# Altium integrated library WCAP-ATG5_rev15a.intlib: 201 symbols (part 1 of 3)
Pins are listed as number, name and electrical type; pins without a type are passive.

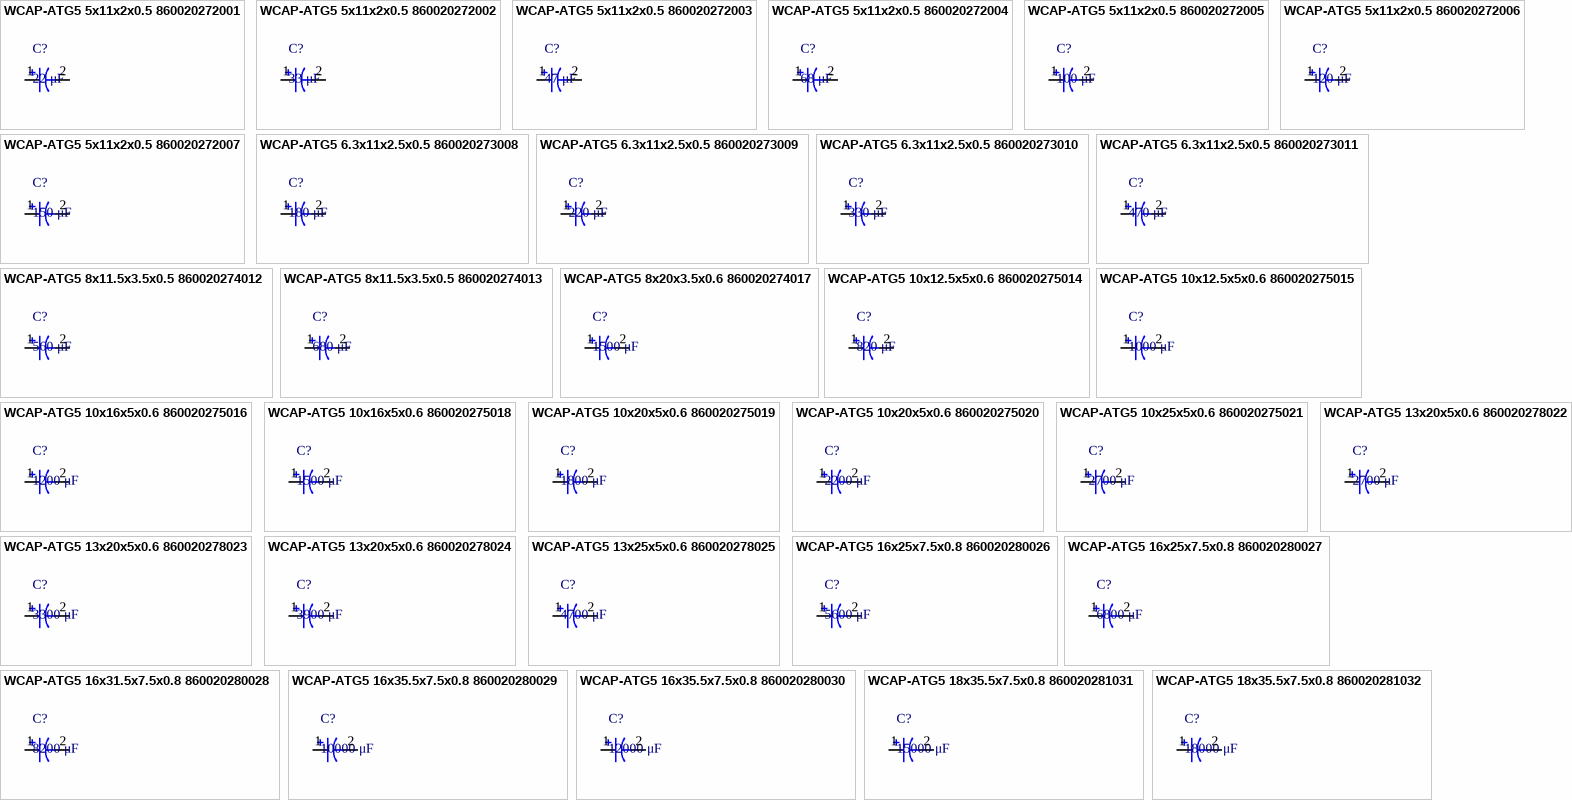
[diagram p0: symbols WCAP-ATG5 5x11x2x0.5 860020272001 to WCAP-ATG5 18x35.5x7.5x0.8 860020281032]

## WCAP-ATG5 5x11x2x0.5 860020272001
designator C?, comment 22 μF
WCAP-ATG5 Aluminum Electrolytic Capacitors , 22 μF; + / - 20%; 10 V , 5 x 11; Manufacturer: Wurth Elektronik; partNo: 860020272001; E-mail: libraries@we-online.com; Characteristics: Aluminum Electrolytic Capacitor; Recommended soldering: Wave; Operating temperature:–40 °C to +105 °C for UR < 400 V; –25 °C to +105 °C for UR ≥ 400 V; General purpose product series with max. temperature of +105 °C; Load life: 2000 h @ +105 °C; ComponentLink1Description: Manufacturer; ComponentLink1URL: http://www.we-online.com; ComponentLink2Description: Datasheet; ComponentLink2URL: http://katalog.we-online.de/pbs/datasheet/860020272001.pdf; Created by: Karrer Zheng; Created Date: 6/8/2015; Capacitance: 22 μF; Application: Medium and high voltage type range from 160V-450V used as primary side input filter in power supply; Low voltage type used as energy storage or low frequency filtering in circuit, applied to general switching power supply, AC-DC converter, adapter, charger, TV, VCR, DC motor circuit filter, digital audio, digital cameras, digital video cameras, satellite receiver etc.
footprint WCAP-ATG5 5x11x2x0.5
pins: 1, 2

## WCAP-ATG5 5x11x2x0.5 860020272002
designator C?, comment 33 μF
WCAP-ATG5 Aluminum Electrolytic Capacitors , 33 μF; + / - 20%; 10 V , 5 x 11; Manufacturer: Wurth Elektronik; partNo: 860020272002; E-mail: libraries@we-online.com; Characteristics: Aluminum Electrolytic Capacitor; Recommended soldering: Wave; Operating temperature:–40 °C to +105 °C for UR < 400 V; –25 °C to +105 °C for UR ≥ 400 V; General purpose product series with max. temperature of +105 °C; Load life: 2000 h @ +105 °C; ComponentLink1Description: Manufacturer; ComponentLink1URL: http://www.we-online.com; ComponentLink2Description: Datasheet; ComponentLink2URL: http://katalog.we-online.de/pbs/datasheet/860020272002.pdf; Created by: Karrer Zheng; Created Date: 6/8/2015; Capacitance: 33 μF; Application: Medium and high voltage type range from 160V-450V used as primary side input filter in power supply; Low voltage type used as energy storage or low frequency filtering in circuit, applied to general switching power supply, AC-DC converter, adapter, charger, TV, VCR, DC motor circuit filter, digital audio, digital cameras, digital video cameras, satellite receiver etc.
footprint WCAP-ATG5 5x11x2x0.5
pins: 1, 2

## WCAP-ATG5 5x11x2x0.5 860020272003
designator C?, comment 47 μF
WCAP-ATG5 Aluminum Electrolytic Capacitors , 47 μF; + / - 20%; 10 V , 5 x 11; Manufacturer: Wurth Elektronik; partNo: 860020272003; E-mail: libraries@we-online.com; Characteristics: Aluminum Electrolytic Capacitor; Recommended soldering: Wave; Operating temperature:–40 °C to +105 °C for UR < 400 V; –25 °C to +105 °C for UR ≥ 400 V; General purpose product series with max. temperature of +105 °C; Load life: 2000 h @ +105 °C; ComponentLink1Description: Manufacturer; ComponentLink1URL: http://www.we-online.com; ComponentLink2Description: Datasheet; ComponentLink2URL: http://katalog.we-online.de/pbs/datasheet/860020272003.pdf; Created by: Karrer Zheng; Created Date: 6/8/2015; Capacitance: 47 μF; Application: Medium and high voltage type range from 160V-450V used as primary side input filter in power supply; Low voltage type used as energy storage or low frequency filtering in circuit, applied to general switching power supply, AC-DC converter, adapter, charger, TV, VCR, DC motor circuit filter, digital audio, digital cameras, digital video cameras, satellite receiver etc.
footprint WCAP-ATG5 5x11x2x0.5
pins: 1, 2

## WCAP-ATG5 5x11x2x0.5 860020272004
designator C?, comment 68 μF
WCAP-ATG5 Aluminum Electrolytic Capacitors , 68 μF; + / - 20%; 10 V , 5 x 11; Manufacturer: Wurth Elektronik; partNo: 860020272004; E-mail: libraries@we-online.com; Characteristics: Aluminum Electrolytic Capacitor; Recommended soldering: Wave; Operating temperature:–40 °C to +105 °C for UR < 400 V; –25 °C to +105 °C for UR ≥ 400 V; General purpose product series with max. temperature of +105 °C; Load life: 2000 h @ +105 °C; ComponentLink1Description: Manufacturer; ComponentLink1URL: http://www.we-online.com; ComponentLink2Description: Datasheet; ComponentLink2URL: http://katalog.we-online.de/pbs/datasheet/860020272004.pdf; Created by: Karrer Zheng; Created Date: 6/8/2015; Capacitance: 68 μF; Application: Medium and high voltage type range from 160V-450V used as primary side input filter in power supply; Low voltage type used as energy storage or low frequency filtering in circuit, applied to general switching power supply, AC-DC converter, adapter, charger, TV, VCR, DC motor circuit filter, digital audio, digital cameras, digital video cameras, satellite receiver etc.
footprint WCAP-ATG5 5x11x2x0.5
pins: 1, 2

## WCAP-ATG5 5x11x2x0.5 860020272005
designator C?, comment 100 μF
WCAP-ATG5 Aluminum Electrolytic Capacitors , 100 μF; + / - 20%; 10 V , 5 x 11; Manufacturer: Wurth Elektronik; partNo: 860020272005; E-mail: libraries@we-online.com; Characteristics: Aluminum Electrolytic Capacitor; Recommended soldering: Wave; Operating temperature:–40 °C to +105 °C for UR < 400 V; –25 °C to +105 °C for UR ≥ 400 V; General purpose product series with max. temperature of +105 °C; Load life: 2000 h @ +105 °C; ComponentLink1Description: Manufacturer; ComponentLink1URL: http://www.we-online.com; ComponentLink2Description: Datasheet; ComponentLink2URL: http://katalog.we-online.de/pbs/datasheet/860020272005.pdf; Created by: Karrer Zheng; Created Date: 6/8/2015; Capacitance: 100 μF; Application: Medium and high voltage type range from 160V-450V used as primary side input filter in power supply; Low voltage type used as energy storage or low frequency filtering in circuit, applied to general switching power supply, AC-DC converter, adapter, charger, TV, VCR, DC motor circuit filter, digital audio, digital cameras, digital video cameras, satellite receiver etc.
footprint WCAP-ATG5 5x11x2x0.5
pins: 1, 2

## WCAP-ATG5 5x11x2x0.5 860020272006
designator C?, comment 120 μF
WCAP-ATG5 Aluminum Electrolytic Capacitors , 120 μF; + / - 20%; 10 V , 5 x 11; Manufacturer: Wurth Elektronik; partNo: 860020272006; E-mail: libraries@we-online.com; Characteristics: Aluminum Electrolytic Capacitor; Recommended soldering: Wave; Operating temperature:–40 °C to +105 °C for UR < 400 V; –25 °C to +105 °C for UR ≥ 400 V; General purpose product series with max. temperature of +105 °C; Load life: 2000 h @ +105 °C; ComponentLink1Description: Manufacturer; ComponentLink1URL: http://www.we-online.com; ComponentLink2Description: Datasheet; ComponentLink2URL: http://katalog.we-online.de/pbs/datasheet/860020272006.pdf; Created by: Karrer Zheng; Created Date: 6/8/2015; Capacitance: 120 μF; Application: Medium and high voltage type range from 160V-450V used as primary side input filter in power supply; Low voltage type used as energy storage or low frequency filtering in circuit, applied to general switching power supply, AC-DC converter, adapter, charger, TV, VCR, DC motor circuit filter, digital audio, digital cameras, digital video cameras, satellite receiver etc.
footprint WCAP-ATG5 5x11x2x0.5
pins: 1, 2

## WCAP-ATG5 5x11x2x0.5 860020272007
designator C?, comment 150 μF
WCAP-ATG5 Aluminum Electrolytic Capacitors , 150 μF; + / - 20%; 10 V , 5 x 11; Manufacturer: Wurth Elektronik; partNo: 860020272007; E-mail: libraries@we-online.com; Characteristics: Aluminum Electrolytic Capacitor; Recommended soldering: Wave; Operating temperature:–40 °C to +105 °C for UR < 400 V; –25 °C to +105 °C for UR ≥ 400 V; General purpose product series with max. temperature of +105 °C; Load life: 2000 h @ +105 °C; ComponentLink1Description: Manufacturer; ComponentLink1URL: http://www.we-online.com; ComponentLink2Description: Datasheet; ComponentLink2URL: http://katalog.we-online.de/pbs/datasheet/860020272007.pdf; Created by: Karrer Zheng; Created Date: 6/8/2015; Capacitance: 150 μF; Application: Medium and high voltage type range from 160V-450V used as primary side input filter in power supply; Low voltage type used as energy storage or low frequency filtering in circuit, applied to general switching power supply, AC-DC converter, adapter, charger, TV, VCR, DC motor circuit filter, digital audio, digital cameras, digital video cameras, satellite receiver etc.
footprint WCAP-ATG5 5x11x2x0.5
pins: 1, 2

## WCAP-ATG5 6.3x11x2.5x0.5 860020273008
designator C?, comment 180 μF
WCAP-ATG5 Aluminum Electrolytic Capacitors , 180 μF; + / - 20%; 10 V , 6,3 x 11; Manufacturer: Wurth Elektronik; partNo: 860020273008; E-mail: libraries@we-online.com; Characteristics: Aluminum Electrolytic Capacitor; Recommended soldering: Wave; Operating temperature:–40 °C to +105 °C for UR < 400 V; –25 °C to +105 °C for UR ≥ 400 V; General purpose product series with max. temperature of +105 °C; Load life: 2000 h @ +105 °C; ComponentLink1Description: Manufacturer; ComponentLink1URL: http://www.we-online.com; ComponentLink2Description: Datasheet; ComponentLink2URL: http://katalog.we-online.de/pbs/datasheet/860020273008.pdf; Created by: Karrer Zheng; Created Date: 6/8/2015; Capacitance: 180 μF; Application: Medium and high voltage type range from 160V-450V used as primary side input filter in power supply; Low voltage type used as energy storage or low frequency filtering in circuit, applied to general switching power supply, AC-DC converter, adapter, charger, TV, VCR, DC motor circuit filter, digital audio, digital cameras, digital video cameras, satellite receiver etc.
footprint WCAP-ATG5 6.3x11x2.5x0.5
pins: 1, 2

## WCAP-ATG5 6.3x11x2.5x0.5 860020273009
designator C?, comment 220 μF
WCAP-ATG5 Aluminum Electrolytic Capacitors , 220 μF; + / - 20%; 10 V , 6,3 x 11; Manufacturer: Wurth Elektronik; partNo: 860020273009; E-mail: libraries@we-online.com; Characteristics: Aluminum Electrolytic Capacitor; Recommended soldering: Wave; Operating temperature:–40 °C to +105 °C for UR < 400 V; –25 °C to +105 °C for UR ≥ 400 V; General purpose product series with max. temperature of +105 °C; Load life: 2000 h @ +105 °C; ComponentLink1Description: Manufacturer; ComponentLink1URL: http://www.we-online.com; ComponentLink2Description: Datasheet; ComponentLink2URL: http://katalog.we-online.de/pbs/datasheet/860020273009.pdf; Created by: Karrer Zheng; Created Date: 6/8/2015; Capacitance: 220 μF; Application: Medium and high voltage type range from 160V-450V used as primary side input filter in power supply; Low voltage type used as energy storage or low frequency filtering in circuit, applied to general switching power supply, AC-DC converter, adapter, charger, TV, VCR, DC motor circuit filter, digital audio, digital cameras, digital video cameras, satellite receiver etc.
footprint WCAP-ATG5 6.3x11x2.5x0.5
pins: 1, 2

## WCAP-ATG5 6.3x11x2.5x0.5 860020273010
designator C?, comment 330 μF
WCAP-ATG5 Aluminum Electrolytic Capacitors , 330 μF; + / - 20%; 10 V , 6,3 x 11; Manufacturer: Wurth Elektronik; partNo: 860020273010; E-mail: libraries@we-online.com; Characteristics: Aluminum Electrolytic Capacitor; Recommended soldering: Wave; Operating temperature:–40 °C to +105 °C for UR < 400 V; –25 °C to +105 °C for UR ≥ 400 V; General purpose product series with max. temperature of +105 °C; Load life: 2000 h @ +105 °C; ComponentLink1Description: Manufacturer; ComponentLink1URL: http://www.we-online.com; ComponentLink2Description: Datasheet; ComponentLink2URL: http://katalog.we-online.de/pbs/datasheet/860020273010.pdf; Created by: Karrer Zheng; Created Date: 6/8/2015; Capacitance: 330 μF; Application: Medium and high voltage type range from 160V-450V used as primary side input filter in power supply; Low voltage type used as energy storage or low frequency filtering in circuit, applied to general switching power supply, AC-DC converter, adapter, charger, TV, VCR, DC motor circuit filter, digital audio, digital cameras, digital video cameras, satellite receiver etc.
footprint WCAP-ATG5 6.3x11x2.5x0.5
pins: 1, 2

## WCAP-ATG5 6.3x11x2.5x0.5 860020273011
designator C?, comment 470 μF
WCAP-ATG5 Aluminum Electrolytic Capacitors , 470 μF; + / - 20%; 10 V , 6,3 x 11; Manufacturer: Wurth Elektronik; partNo: 860020273011; E-mail: libraries@we-online.com; Characteristics: Aluminum Electrolytic Capacitor; Recommended soldering: Wave; Operating temperature:–40 °C to +105 °C for UR < 400 V; –25 °C to +105 °C for UR ≥ 400 V; General purpose product series with max. temperature of +105 °C; Load life: 2000 h @ +105 °C; ComponentLink1Description: Manufacturer; ComponentLink1URL: http://www.we-online.com; ComponentLink2Description: Datasheet; ComponentLink2URL: http://katalog.we-online.de/pbs/datasheet/860020273011.pdf; Created by: Karrer Zheng; Created Date: 6/8/2015; Capacitance: 470 μF; Application: Medium and high voltage type range from 160V-450V used as primary side input filter in power supply; Low voltage type used as energy storage or low frequency filtering in circuit, applied to general switching power supply, AC-DC converter, adapter, charger, TV, VCR, DC motor circuit filter, digital audio, digital cameras, digital video cameras, satellite receiver etc.
footprint WCAP-ATG5 6.3x11x2.5x0.5
pins: 1, 2

## WCAP-ATG5 8x11.5x3.5x0.5 860020274012
designator C?, comment 560 μF
WCAP-ATG5 Aluminum Electrolytic Capacitors , 560 μF; + / - 20%; 10 V , 8 x 11,5; Manufacturer: Wurth Elektronik; partNo: 860020274012; E-mail: libraries@we-online.com; Characteristics: Aluminum Electrolytic Capacitor; Recommended soldering: Wave; Operating temperature:–40 °C to +105 °C for UR < 400 V; –25 °C to +105 °C for UR ≥ 400 V; General purpose product series with max. temperature of +105 °C; Load life: 2000 h @ +105 °C; ComponentLink1Description: Manufacturer; ComponentLink1URL: http://www.we-online.com; ComponentLink2Description: Datasheet; ComponentLink2URL: http://katalog.we-online.de/pbs/datasheet/860020274012.pdf; Created by: Karrer Zheng; Created Date: 6/8/2015; Capacitance: 560 μF; Application: Medium and high voltage type range from 160V-450V used as primary side input filter in power supply; Low voltage type used as energy storage or low frequency filtering in circuit, applied to general switching power supply, AC-DC converter, adapter, charger, TV, VCR, DC motor circuit filter, digital audio, digital cameras, digital video cameras, satellite receiver etc.
footprint WCAP-ATG5 8x11.5x3.5x0.5
pins: 1, 2

## WCAP-ATG5 8x11.5x3.5x0.5 860020274013
designator C?, comment 680 μF
WCAP-ATG5 Aluminum Electrolytic Capacitors , 680 μF; + / - 20%; 10 V , 8 x 11,5; Manufacturer: Wurth Elektronik; partNo: 860020274013; E-mail: libraries@we-online.com; Characteristics: Aluminum Electrolytic Capacitor; Recommended soldering: Wave; Operating temperature:–40 °C to +105 °C for UR < 400 V; –25 °C to +105 °C for UR ≥ 400 V; General purpose product series with max. temperature of +105 °C; Load life: 2000 h @ +105 °C; ComponentLink1Description: Manufacturer; ComponentLink1URL: http://www.we-online.com; ComponentLink2Description: Datasheet; ComponentLink2URL: http://katalog.we-online.de/pbs/datasheet/860020274013.pdf; Created by: Karrer Zheng; Created Date: 6/8/2015; Capacitance: 680 μF; Application: Medium and high voltage type range from 160V-450V used as primary side input filter in power supply; Low voltage type used as energy storage or low frequency filtering in circuit, applied to general switching power supply, AC-DC converter, adapter, charger, TV, VCR, DC motor circuit filter, digital audio, digital cameras, digital video cameras, satellite receiver etc.
footprint WCAP-ATG5 8x11.5x3.5x0.5
pins: 1, 2

## WCAP-ATG5 8x20x3.5x0.6 860020274017
designator C?, comment 1500 μF
WCAP-ATG5 Aluminum Electrolytic Capacitors , 1500 μF; + / - 20%; 10 V , 8 x 20; Manufacturer: Wurth Elektronik; partNo: 860020274017; E-mail: libraries@we-online.com; Characteristics: Aluminum Electrolytic Capacitor; Recommended soldering: Wave; Operating temperature:–40 °C to +105 °C for UR < 400 V; –25 °C to +105 °C for UR ≥ 400 V; General purpose product series with max. temperature of +105 °C; Load life: 2000 h @ +105 °C; ComponentLink1Description: Manufacturer; ComponentLink1URL: http://www.we-online.com; ComponentLink2Description: Datasheet; ComponentLink2URL: http://katalog.we-online.de/pbs/datasheet/860020274017.pdf; Created by: Karrer Zheng; Created Date: 6/8/2015; Capacitance: 1500 μF; Application: Medium and high voltage type range from 160V-450V used as primary side input filter in power supply; Low voltage type used as energy storage or low frequency filtering in circuit, applied to general switching power supply, AC-DC converter, adapter, charger, TV, VCR, DC motor circuit filter, digital audio, digital cameras, digital video cameras, satellite receiver etc.
footprint WCAP-ATG5 8x20x3.5x0.6
pins: 1, 2

## WCAP-ATG5 10x12.5x5x0.6 860020275014
designator C?, comment 820 μF
WCAP-ATG5 Aluminum Electrolytic Capacitors , 820 μF; + / - 20%; 10 V , 10 x 12,5; Manufacturer: Wurth Elektronik; partNo: 860020275014; E-mail: libraries@we-online.com; Characteristics: Aluminum Electrolytic Capacitor; Recommended soldering: Wave; Operating temperature:–40 °C to +105 °C for UR < 400 V; –25 °C to +105 °C for UR ≥ 400 V; General purpose product series with max. temperature of +105 °C; Load life: 2000 h @ +105 °C; ComponentLink1Description: Manufacturer; ComponentLink1URL: http://www.we-online.com; ComponentLink2Description: Datasheet; ComponentLink2URL: http://katalog.we-online.de/pbs/datasheet/860020275014.pdf; Created by: Karrer Zheng; Created Date: 6/8/2015; Capacitance: 820 μF; Application: Medium and high voltage type range from 160V-450V used as primary side input filter in power supply; Low voltage type used as energy storage or low frequency filtering in circuit, applied to general switching power supply, AC-DC converter, adapter, charger, TV, VCR, DC motor circuit filter, digital audio, digital cameras, digital video cameras, satellite receiver etc.
footprint WCAP-ATG5 10x12.5x5x0.6
pins: 1, 2

## WCAP-ATG5 10x12.5x5x0.6 860020275015
designator C?, comment 1000 μF
WCAP-ATG5 Aluminum Electrolytic Capacitors , 1000 μF; + / - 20%; 10 V , 10 x 12,5; Manufacturer: Wurth Elektronik; partNo: 860020275015; E-mail: libraries@we-online.com; Characteristics: Aluminum Electrolytic Capacitor; Recommended soldering: Wave; Operating temperature:–40 °C to +105 °C for UR < 400 V; –25 °C to +105 °C for UR ≥ 400 V; General purpose product series with max. temperature of +105 °C; Load life: 2000 h @ +105 °C; ComponentLink1Description: Manufacturer; ComponentLink1URL: http://www.we-online.com; ComponentLink2Description: Datasheet; ComponentLink2URL: http://katalog.we-online.de/pbs/datasheet/860020275015.pdf; Created by: Karrer Zheng; Created Date: 6/8/2015; Capacitance: 1000 μF; Application: Medium and high voltage type range from 160V-450V used as primary side input filter in power supply; Low voltage type used as energy storage or low frequency filtering in circuit, applied to general switching power supply, AC-DC converter, adapter, charger, TV, VCR, DC motor circuit filter, digital audio, digital cameras, digital video cameras, satellite receiver etc.
footprint WCAP-ATG5 10x12.5x5x0.6
pins: 1, 2

## WCAP-ATG5 10x16x5x0.6 860020275016
designator C?, comment 1200 μF
WCAP-ATG5 Aluminum Electrolytic Capacitors , 1200 μF; + / - 20%; 10 V , 10 x 16; Manufacturer: Wurth Elektronik; partNo: 860020275016; E-mail: libraries@we-online.com; Characteristics: Aluminum Electrolytic Capacitor; Recommended soldering: Wave; Operating temperature:–40 °C to +105 °C for UR < 400 V; –25 °C to +105 °C for UR ≥ 400 V; General purpose product series with max. temperature of +105 °C; Load life: 2000 h @ +105 °C; ComponentLink1Description: Manufacturer; ComponentLink1URL: http://www.we-online.com; ComponentLink2Description: Datasheet; ComponentLink2URL: http://katalog.we-online.de/pbs/datasheet/860020275016.pdf; Created by: Karrer Zheng; Created Date: 6/8/2015; Capacitance: 1200 μF; Application: Medium and high voltage type range from 160V-450V used as primary side input filter in power supply; Low voltage type used as energy storage or low frequency filtering in circuit, applied to general switching power supply, AC-DC converter, adapter, charger, TV, VCR, DC motor circuit filter, digital audio, digital cameras, digital video cameras, satellite receiver etc.
footprint WCAP-ATG5 10x16x5x0.6
pins: 1, 2

## WCAP-ATG5 10x16x5x0.6 860020275018
designator C?, comment 1500 μF
WCAP-ATG5 Aluminum Electrolytic Capacitors , 1500 μF; + / - 20%; 10 V , 10 x 16; Manufacturer: Wurth Elektronik; partNo: 860020275018; E-mail: libraries@we-online.com; Characteristics: Aluminum Electrolytic Capacitor; Recommended soldering: Wave; Operating temperature:–40 °C to +105 °C for UR < 400 V; –25 °C to +105 °C for UR ≥ 400 V; General purpose product series with max. temperature of +105 °C; Load life: 2000 h @ +105 °C; ComponentLink1Description: Manufacturer; ComponentLink1URL: http://www.we-online.com; ComponentLink2Description: Datasheet; ComponentLink2URL: http://katalog.we-online.de/pbs/datasheet/860020275018.pdf; Created by: Karrer Zheng; Created Date: 6/8/2015; Capacitance: 1500 μF; Application: Medium and high voltage type range from 160V-450V used as primary side input filter in power supply; Low voltage type used as energy storage or low frequency filtering in circuit, applied to general switching power supply, AC-DC converter, adapter, charger, TV, VCR, DC motor circuit filter, digital audio, digital cameras, digital video cameras, satellite receiver etc.
footprint WCAP-ATG5 10x16x5x0.6
pins: 1, 2

## WCAP-ATG5 10x20x5x0.6 860020275019
designator C?, comment 1800 μF
WCAP-ATG5 Aluminum Electrolytic Capacitors , 1800 μF; + / - 20%; 10 V , 10 x 20; Manufacturer: Wurth Elektronik; partNo: 860020275019; E-mail: libraries@we-online.com; Characteristics: Aluminum Electrolytic Capacitor; Recommended soldering: Wave; Operating temperature:–40 °C to +105 °C for UR < 400 V; –25 °C to +105 °C for UR ≥ 400 V; General purpose product series with max. temperature of +105 °C; Load life: 2000 h @ +105 °C; ComponentLink1Description: Manufacturer; ComponentLink1URL: http://www.we-online.com; ComponentLink2Description: Datasheet; ComponentLink2URL: http://katalog.we-online.de/pbs/datasheet/860020275019.pdf; Created by: Karrer Zheng; Created Date: 6/8/2015; Capacitance: 1800 μF; Application: Medium and high voltage type range from 160V-450V used as primary side input filter in power supply; Low voltage type used as energy storage or low frequency filtering in circuit, applied to general switching power supply, AC-DC converter, adapter, charger, TV, VCR, DC motor circuit filter, digital audio, digital cameras, digital video cameras, satellite receiver etc.
footprint WCAP-ATG5 10x20x5x0.6
pins: 1, 2

## WCAP-ATG5 10x20x5x0.6 860020275020
designator C?, comment 2200 μF
WCAP-ATG5 Aluminum Electrolytic Capacitors , 2200 μF; + / - 20%; 10 V , 10 x 20; Manufacturer: Wurth Elektronik; partNo: 860020275020; E-mail: libraries@we-online.com; Characteristics: Aluminum Electrolytic Capacitor; Recommended soldering: Wave; Operating temperature:–40 °C to +105 °C for UR < 400 V; –25 °C to +105 °C for UR ≥ 400 V; General purpose product series with max. temperature of +105 °C; Load life: 2000 h @ +105 °C; ComponentLink1Description: Manufacturer; ComponentLink1URL: http://www.we-online.com; ComponentLink2Description: Datasheet; ComponentLink2URL: http://katalog.we-online.de/pbs/datasheet/860020275020.pdf; Created by: Karrer Zheng; Created Date: 6/8/2015; Capacitance: 2200 μF; Application: Medium and high voltage type range from 160V-450V used as primary side input filter in power supply; Low voltage type used as energy storage or low frequency filtering in circuit, applied to general switching power supply, AC-DC converter, adapter, charger, TV, VCR, DC motor circuit filter, digital audio, digital cameras, digital video cameras, satellite receiver etc.
footprint WCAP-ATG5 10x20x5x0.6
pins: 1, 2

## WCAP-ATG5 10x25x5x0.6 860020275021
designator C?, comment 2700 μF
WCAP-ATG5 Aluminum Electrolytic Capacitors , 2700 μF; + / - 20%; 10 V , 10 x 25; Manufacturer: Wurth Elektronik; partNo: 860020275021; E-mail: libraries@we-online.com; Characteristics: Aluminum Electrolytic Capacitor; Recommended soldering: Wave; Operating temperature:–40 °C to +105 °C for UR < 400 V; –25 °C to +105 °C for UR ≥ 400 V; General purpose product series with max. temperature of +105 °C; Load life: 2000 h @ +105 °C; ComponentLink1Description: Manufacturer; ComponentLink1URL: http://www.we-online.com; ComponentLink2Description: Datasheet; ComponentLink2URL: http://katalog.we-online.de/pbs/datasheet/860020275021.pdf; Created by: Karrer Zheng; Created Date: 6/8/2015; Capacitance: 2700 μF; Application: Medium and high voltage type range from 160V-450V used as primary side input filter in power supply; Low voltage type used as energy storage or low frequency filtering in circuit, applied to general switching power supply, AC-DC converter, adapter, charger, TV, VCR, DC motor circuit filter, digital audio, digital cameras, digital video cameras, satellite receiver etc.
footprint WCAP-ATG5 10x25x5x0.6
pins: 1, 2

## WCAP-ATG5 13x20x5x0.6 860020278022
designator C?, comment 2700 μF
WCAP-ATG5 Aluminum Electrolytic Capacitors , 2700 μF; + / - 20%; 10 V , 13 x 20; Manufacturer: Wurth Elektronik; partNo: 860020278022; E-mail: libraries@we-online.com; Characteristics: Aluminum Electrolytic Capacitor; Recommended soldering: Wave; Operating temperature:–40 °C to +105 °C for UR < 400 V; –25 °C to +105 °C for UR ≥ 400 V; General purpose product series with max. temperature of +105 °C; Load life: 2000 h @ +105 °C; ComponentLink1Description: Manufacturer; ComponentLink1URL: http://www.we-online.com; ComponentLink2Description: Datasheet; ComponentLink2URL: http://katalog.we-online.de/pbs/datasheet/860020278022.pdf; Created by: Karrer Zheng; Created Date: 6/8/2015; Capacitance: 2700 μF; Application: Medium and high voltage type range from 160V-450V used as primary side input filter in power supply; Low voltage type used as energy storage or low frequency filtering in circuit, applied to general switching power supply, AC-DC converter, adapter, charger, TV, VCR, DC motor circuit filter, digital audio, digital cameras, digital video cameras, satellite receiver etc.
footprint WCAP-ATG5 13x20x5x0.6
pins: 1, 2

## WCAP-ATG5 13x20x5x0.6 860020278023
designator C?, comment 3300 μF
WCAP-ATG5 Aluminum Electrolytic Capacitors , 3300 μF; + / - 20%; 10 V , 13 x 20; Manufacturer: Wurth Elektronik; partNo: 860020278023; E-mail: libraries@we-online.com; Characteristics: Aluminum Electrolytic Capacitor; Recommended soldering: Wave; Operating temperature:–40 °C to +105 °C for UR < 400 V; –25 °C to +105 °C for UR ≥ 400 V; General purpose product series with max. temperature of +105 °C; Load life: 2000 h @ +105 °C; ComponentLink1Description: Manufacturer; ComponentLink1URL: http://www.we-online.com; ComponentLink2Description: Datasheet; ComponentLink2URL: http://katalog.we-online.de/pbs/datasheet/860020278023.pdf; Created by: Karrer Zheng; Created Date: 6/8/2015; Capacitance: 3300 μF; Application: Medium and high voltage type range from 160V-450V used as primary side input filter in power supply; Low voltage type used as energy storage or low frequency filtering in circuit, applied to general switching power supply, AC-DC converter, adapter, charger, TV, VCR, DC motor circuit filter, digital audio, digital cameras, digital video cameras, satellite receiver etc.
footprint WCAP-ATG5 13x20x5x0.6
pins: 1, 2

## WCAP-ATG5 13x20x5x0.6 860020278024
designator C?, comment 3900 μF
WCAP-ATG5 Aluminum Electrolytic Capacitors , 3900 μF; + / - 20%; 10 V , 13 x 20; Manufacturer: Wurth Elektronik; partNo: 860020278024; E-mail: libraries@we-online.com; Characteristics: Aluminum Electrolytic Capacitor; Recommended soldering: Wave; Operating temperature:–40 °C to +105 °C for UR < 400 V; –25 °C to +105 °C for UR ≥ 400 V; General purpose product series with max. temperature of +105 °C; Load life: 2000 h @ +105 °C; ComponentLink1Description: Manufacturer; ComponentLink1URL: http://www.we-online.com; ComponentLink2Description: Datasheet; ComponentLink2URL: http://katalog.we-online.de/pbs/datasheet/860020278024.pdf; Created by: Karrer Zheng; Created Date: 6/8/2015; Capacitance: 3900 μF; Application: Medium and high voltage type range from 160V-450V used as primary side input filter in power supply; Low voltage type used as energy storage or low frequency filtering in circuit, applied to general switching power supply, AC-DC converter, adapter, charger, TV, VCR, DC motor circuit filter, digital audio, digital cameras, digital video cameras, satellite receiver etc.
footprint WCAP-ATG5 13x20x5x0.6
pins: 1, 2

## WCAP-ATG5 13x25x5x0.6 860020278025
designator C?, comment 4700 μF
WCAP-ATG5 Aluminum Electrolytic Capacitors , 4700 μF; + / - 20%; 10 V , 13 x 25; Manufacturer: Wurth Elektronik; partNo: 860020278025; E-mail: libraries@we-online.com; Characteristics: Aluminum Electrolytic Capacitor; Recommended soldering: Wave; Operating temperature:–40 °C to +105 °C for UR < 400 V; –25 °C to +105 °C for UR ≥ 400 V; General purpose product series with max. temperature of +105 °C; Load life: 2000 h @ +105 °C; ComponentLink1Description: Manufacturer; ComponentLink1URL: http://www.we-online.com; ComponentLink2Description: Datasheet; ComponentLink2URL: http://katalog.we-online.de/pbs/datasheet/860020278025.pdf; Created by: Karrer Zheng; Created Date: 6/8/2015; Capacitance: 4700 μF; Application: Medium and high voltage type range from 160V-450V used as primary side input filter in power supply; Low voltage type used as energy storage or low frequency filtering in circuit, applied to general switching power supply, AC-DC converter, adapter, charger, TV, VCR, DC motor circuit filter, digital audio, digital cameras, digital video cameras, satellite receiver etc.
footprint WCAP-ATG5 13x25x5x0.6
pins: 1, 2

## WCAP-ATG5 16x25x7.5x0.8 860020280026
designator C?, comment 5600 μF
WCAP-ATG5 Aluminum Electrolytic Capacitors , 5600 μF; + / - 20%; 10 V , 16 x 25; Manufacturer: Wurth Elektronik; partNo: 860020280026; E-mail: libraries@we-online.com; Characteristics: Aluminum Electrolytic Capacitor; Recommended soldering: Wave; Operating temperature:–40 °C to +105 °C for UR < 400 V; –25 °C to +105 °C for UR ≥ 400 V; General purpose product series with max. temperature of +105 °C; Load life: 2000 h @ +105 °C; ComponentLink1Description: Manufacturer; ComponentLink1URL: http://www.we-online.com; ComponentLink2Description: Datasheet; ComponentLink2URL: http://katalog.we-online.de/pbs/datasheet/860020280026.pdf; Created by: Karrer Zheng; Created Date: 6/8/2015; Capacitance: 5600 μF; Application: Medium and high voltage type range from 160V-450V used as primary side input filter in power supply; Low voltage type used as energy storage or low frequency filtering in circuit, applied to general switching power supply, AC-DC converter, adapter, charger, TV, VCR, DC motor circuit filter, digital audio, digital cameras, digital video cameras, satellite receiver etc.
footprint WCAP-ATG5 16x25x7.5x0.8
pins: 1, 2

## WCAP-ATG5 16x25x7.5x0.8 860020280027
designator C?, comment 6800 μF
WCAP-ATG5 Aluminum Electrolytic Capacitors , 6800 μF; + / - 20%; 10 V , 16 x 25; Manufacturer: Wurth Elektronik; partNo: 860020280027; E-mail: libraries@we-online.com; Characteristics: Aluminum Electrolytic Capacitor; Recommended soldering: Wave; Operating temperature:–40 °C to +105 °C for UR < 400 V; –25 °C to +105 °C for UR ≥ 400 V; General purpose product series with max. temperature of +105 °C; Load life: 2000 h @ +105 °C; ComponentLink1Description: Manufacturer; ComponentLink1URL: http://www.we-online.com; ComponentLink2Description: Datasheet; ComponentLink2URL: http://katalog.we-online.de/pbs/datasheet/860020280027.pdf; Created by: Karrer Zheng; Created Date: 6/8/2015; Capacitance: 6800 μF; Application: Medium and high voltage type range from 160V-450V used as primary side input filter in power supply; Low voltage type used as energy storage or low frequency filtering in circuit, applied to general switching power supply, AC-DC converter, adapter, charger, TV, VCR, DC motor circuit filter, digital audio, digital cameras, digital video cameras, satellite receiver etc.
footprint WCAP-ATG5 16x25x7.5x0.8
pins: 1, 2

## WCAP-ATG5 16x31.5x7.5x0.8 860020280028
designator C?, comment 8200 μF
WCAP-ATG5 Aluminum Electrolytic Capacitors , 8200 μF; + / - 20%; 10 V , 16 x 31,5; Manufacturer: Wurth Elektronik; partNo: 860020280028; E-mail: libraries@we-online.com; Characteristics: Aluminum Electrolytic Capacitor; Recommended soldering: Wave; Operating temperature:–40 °C to +105 °C for UR < 400 V; –25 °C to +105 °C for UR ≥ 400 V; General purpose product series with max. temperature of +105 °C; Load life: 2000 h @ +105 °C; ComponentLink1Description: Manufacturer; ComponentLink1URL: http://www.we-online.com; ComponentLink2Description: Datasheet; ComponentLink2URL: http://katalog.we-online.de/pbs/datasheet/860020280028.pdf; Created by: Karrer Zheng; Created Date: 6/8/2015; Capacitance: 8200 μF; Application: Medium and high voltage type range from 160V-450V used as primary side input filter in power supply; Low voltage type used as energy storage or low frequency filtering in circuit, applied to general switching power supply, AC-DC converter, adapter, charger, TV, VCR, DC motor circuit filter, digital audio, digital cameras, digital video cameras, satellite receiver etc.
footprint WCAP-ATG5 16x31.5x7.5x0.8
pins: 1, 2

## WCAP-ATG5 16x35.5x7.5x0.8 860020280029
designator C?, comment 10000 μF
WCAP-ATG5 Aluminum Electrolytic Capacitors , 10000 μF; + / - 20%; 10 V , 16 x 35,5; Manufacturer: Wurth Elektronik; partNo: 860020280029; E-mail: libraries@we-online.com; Characteristics: Aluminum Electrolytic Capacitor; Recommended soldering: Wave; Operating temperature:–40 °C to +105 °C for UR < 400 V; –25 °C to +105 °C for UR ≥ 400 V; General purpose product series with max. temperature of +105 °C; Load life: 2000 h @ +105 °C; ComponentLink1Description: Manufacturer; ComponentLink1URL: http://www.we-online.com; ComponentLink2Description: Datasheet; ComponentLink2URL: http://katalog.we-online.de/pbs/datasheet/860020280029.pdf; Created by: Karrer Zheng; Created Date: 6/8/2015; Capacitance: 10000 μF; Application: Medium and high voltage type range from 160V-450V used as primary side input filter in power supply; Low voltage type used as energy storage or low frequency filtering in circuit, applied to general switching power supply, AC-DC converter, adapter, charger, TV, VCR, DC motor circuit filter, digital audio, digital cameras, digital video cameras, satellite receiver etc.
footprint WCAP-ATG5 16x35.5x7.5x0.8
pins: 1, 2

## WCAP-ATG5 16x35.5x7.5x0.8 860020280030
designator C?, comment 12000 μF
WCAP-ATG5 Aluminum Electrolytic Capacitors , 12000 μF; + / - 20%; 10 V , 16 x 35,5; Manufacturer: Wurth Elektronik; partNo: 860020280030; E-mail: libraries@we-online.com; Characteristics: Aluminum Electrolytic Capacitor; Recommended soldering: Wave; Operating temperature:–40 °C to +105 °C for UR < 400 V; –25 °C to +105 °C for UR ≥ 400 V; General purpose product series with max. temperature of +105 °C; Load life: 2000 h @ +105 °C; ComponentLink1Description: Manufacturer; ComponentLink1URL: http://www.we-online.com; ComponentLink2Description: Datasheet; ComponentLink2URL: http://katalog.we-online.de/pbs/datasheet/860020280030.pdf; Created by: Karrer Zheng; Created Date: 6/8/2015; Capacitance: 12000 μF; Application: Medium and high voltage type range from 160V-450V used as primary side input filter in power supply; Low voltage type used as energy storage or low frequency filtering in circuit, applied to general switching power supply, AC-DC converter, adapter, charger, TV, VCR, DC motor circuit filter, digital audio, digital cameras, digital video cameras, satellite receiver etc.
footprint WCAP-ATG5 16x35.5x7.5x0.8
pins: 1, 2

## WCAP-ATG5 18x35.5x7.5x0.8 860020281031
designator C?, comment 15000 μF
WCAP-ATG5 Aluminum Electrolytic Capacitors , 15000 μF; + / - 20%; 10 V , 18 x 35,5; Manufacturer: Wurth Elektronik; partNo: 860020281031; E-mail: libraries@we-online.com; Characteristics: Aluminum Electrolytic Capacitor; Recommended soldering: Wave; Operating temperature:–40 °C to +105 °C for UR < 400 V; –25 °C to +105 °C for UR ≥ 400 V; General purpose product series with max. temperature of +105 °C; Load life: 2000 h @ +105 °C; ComponentLink1Description: Manufacturer; ComponentLink1URL: http://www.we-online.com; ComponentLink2Description: Datasheet; ComponentLink2URL: http://katalog.we-online.de/pbs/datasheet/860020281031.pdf; Created by: Karrer Zheng; Created Date: 6/8/2015; Capacitance: 15000 μF; Application: Medium and high voltage type range from 160V-450V used as primary side input filter in power supply; Low voltage type used as energy storage or low frequency filtering in circuit, applied to general switching power supply, AC-DC converter, adapter, charger, TV, VCR, DC motor circuit filter, digital audio, digital cameras, digital video cameras, satellite receiver etc.
footprint WCAP-ATG5 18x35.5x7.5x0.8
pins: 1, 2

## WCAP-ATG5 18x35.5x7.5x0.8 860020281032
designator C?, comment 18000 μF
WCAP-ATG5 Aluminum Electrolytic Capacitors , 18000 μF; + / - 20%; 10 V , 18 x 35,5; Manufacturer: Wurth Elektronik; partNo: 860020281032; E-mail: libraries@we-online.com; Characteristics: Aluminum Electrolytic Capacitor; Recommended soldering: Wave; Operating temperature:–40 °C to +105 °C for UR < 400 V; –25 °C to +105 °C for UR ≥ 400 V; General purpose product series with max. temperature of +105 °C; Load life: 2000 h @ +105 °C; ComponentLink1Description: Manufacturer; ComponentLink1URL: http://www.we-online.com; ComponentLink2Description: Datasheet; ComponentLink2URL: http://katalog.we-online.de/pbs/datasheet/860020281032.pdf; Created by: Karrer Zheng; Created Date: 6/8/2015; Capacitance: 18000 μF; Application: Medium and high voltage type range from 160V-450V used as primary side input filter in power supply; Low voltage type used as energy storage or low frequency filtering in circuit, applied to general switching power supply, AC-DC converter, adapter, charger, TV, VCR, DC motor circuit filter, digital audio, digital cameras, digital video cameras, satellite receiver etc.
footprint WCAP-ATG5 18x35.5x7.5x0.8
pins: 1, 2


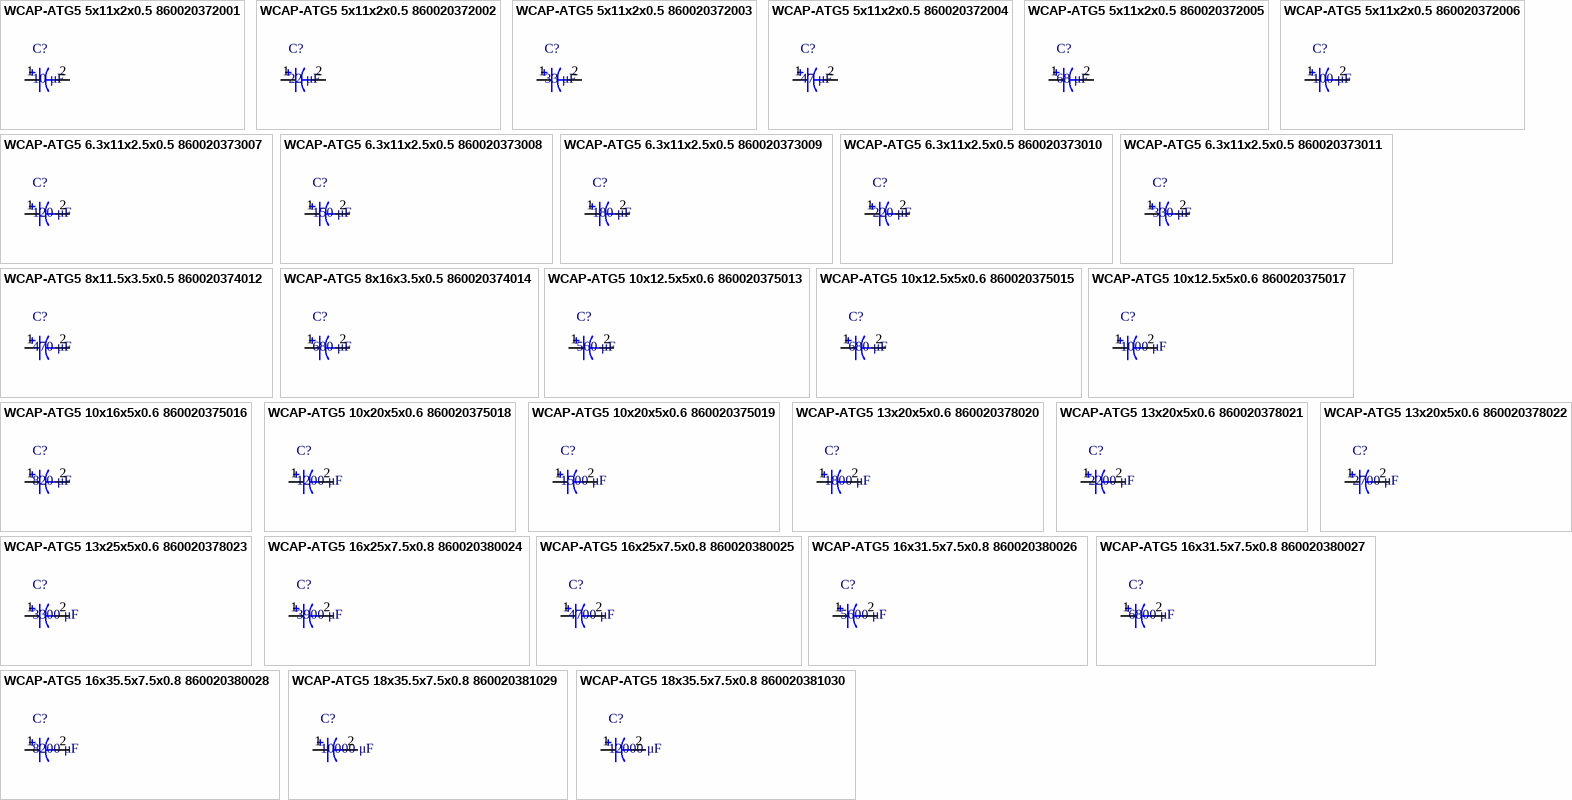
[diagram p1: symbols WCAP-ATG5 5x11x2x0.5 860020372001 to WCAP-ATG5 18x35.5x7.5x0.8 860020381030]

## WCAP-ATG5 5x11x2x0.5 860020372001
designator C?, comment 10 μF
WCAP-ATG5 Aluminum Electrolytic Capacitors , 10 μF; + / - 20%; 16 V , 5 x 11; Manufacturer: Wurth Elektronik; partNo: 860020372001; E-mail: libraries@we-online.com; Characteristics: Aluminum Electrolytic Capacitor; Recommended soldering: Wave; Operating temperature:–40 °C to +105 °C for UR < 400 V; –25 °C to +105 °C for UR ≥ 400 V; General purpose product series with max. temperature of +105 °C; Load life: 2000 h @ +105 °C; ComponentLink1Description: Manufacturer; ComponentLink1URL: http://www.we-online.com; ComponentLink2Description: Datasheet; ComponentLink2URL: http://katalog.we-online.de/pbs/datasheet/860020372001.pdf; Created by: Karrer Zheng; Created Date: 6/8/2015; Capacitance: 10 μF; Application: Medium and high voltage type range from 160V-450V used as primary side input filter in power supply; Low voltage type used as energy storage or low frequency filtering in circuit, applied to general switching power supply, AC-DC converter, adapter, charger, TV, VCR, DC motor circuit filter, digital audio, digital cameras, digital video cameras, satellite receiver etc.
footprint WCAP-ATG5 5x11x2x0.5
pins: 1, 2

## WCAP-ATG5 5x11x2x0.5 860020372002
designator C?, comment 22 μF
WCAP-ATG5 Aluminum Electrolytic Capacitors , 22 μF; + / - 20%; 16 V , 5 x 11; Manufacturer: Wurth Elektronik; partNo: 860020372002; E-mail: libraries@we-online.com; Characteristics: Aluminum Electrolytic Capacitor; Recommended soldering: Wave; Operating temperature:–40 °C to +105 °C for UR < 400 V; –25 °C to +105 °C for UR ≥ 400 V; General purpose product series with max. temperature of +105 °C; Load life: 2000 h @ +105 °C; ComponentLink1Description: Manufacturer; ComponentLink1URL: http://www.we-online.com; ComponentLink2Description: Datasheet; ComponentLink2URL: http://katalog.we-online.de/pbs/datasheet/860020372002.pdf; Created by: Karrer Zheng; Created Date: 6/8/2015; Capacitance: 22 μF; Application: Medium and high voltage type range from 160V-450V used as primary side input filter in power supply; Low voltage type used as energy storage or low frequency filtering in circuit, applied to general switching power supply, AC-DC converter, adapter, charger, TV, VCR, DC motor circuit filter, digital audio, digital cameras, digital video cameras, satellite receiver etc.
footprint WCAP-ATG5 5x11x2x0.5
pins: 1, 2

## WCAP-ATG5 5x11x2x0.5 860020372003
designator C?, comment 33 μF
WCAP-ATG5 Aluminum Electrolytic Capacitors , 33 μF; + / - 20%; 16 V , 5 x 11; Manufacturer: Wurth Elektronik; partNo: 860020372003; E-mail: libraries@we-online.com; Characteristics: Aluminum Electrolytic Capacitor; Recommended soldering: Wave; Operating temperature:–40 °C to +105 °C for UR < 400 V; –25 °C to +105 °C for UR ≥ 400 V; General purpose product series with max. temperature of +105 °C; Load life: 2000 h @ +105 °C; ComponentLink1Description: Manufacturer; ComponentLink1URL: http://www.we-online.com; ComponentLink2Description: Datasheet; ComponentLink2URL: http://katalog.we-online.de/pbs/datasheet/860020372003.pdf; Created by: Karrer Zheng; Created Date: 6/8/2015; Capacitance: 33 μF; Application: Medium and high voltage type range from 160V-450V used as primary side input filter in power supply; Low voltage type used as energy storage or low frequency filtering in circuit, applied to general switching power supply, AC-DC converter, adapter, charger, TV, VCR, DC motor circuit filter, digital audio, digital cameras, digital video cameras, satellite receiver etc.
footprint WCAP-ATG5 5x11x2x0.5
pins: 1, 2

## WCAP-ATG5 5x11x2x0.5 860020372004
designator C?, comment 47 μF
WCAP-ATG5 Aluminum Electrolytic Capacitors , 47 μF; + / - 20%; 16 V , 5 x 11; Manufacturer: Wurth Elektronik; partNo: 860020372004; E-mail: libraries@we-online.com; Characteristics: Aluminum Electrolytic Capacitor; Recommended soldering: Wave; Operating temperature:–40 °C to +105 °C for UR < 400 V; –25 °C to +105 °C for UR ≥ 400 V; General purpose product series with max. temperature of +105 °C; Load life: 2000 h @ +105 °C; ComponentLink1Description: Manufacturer; ComponentLink1URL: http://www.we-online.com; ComponentLink2Description: Datasheet; ComponentLink2URL: http://katalog.we-online.de/pbs/datasheet/860020372004.pdf; Created by: Karrer Zheng; Created Date: 6/8/2015; Capacitance: 47 μF; Application: Medium and high voltage type range from 160V-450V used as primary side input filter in power supply; Low voltage type used as energy storage or low frequency filtering in circuit, applied to general switching power supply, AC-DC converter, adapter, charger, TV, VCR, DC motor circuit filter, digital audio, digital cameras, digital video cameras, satellite receiver etc.
footprint WCAP-ATG5 5x11x2x0.5
pins: 1, 2

## WCAP-ATG5 5x11x2x0.5 860020372005
designator C?, comment 68 μF
WCAP-ATG5 Aluminum Electrolytic Capacitors , 68 μF; + / - 20%; 16 V , 5 x 11; Manufacturer: Wurth Elektronik; partNo: 860020372005; E-mail: libraries@we-online.com; Characteristics: Aluminum Electrolytic Capacitor; Recommended soldering: Wave; Operating temperature:–40 °C to +105 °C for UR < 400 V; –25 °C to +105 °C for UR ≥ 400 V; General purpose product series with max. temperature of +105 °C; Load life: 2000 h @ +105 °C; ComponentLink1Description: Manufacturer; ComponentLink1URL: http://www.we-online.com; ComponentLink2Description: Datasheet; ComponentLink2URL: http://katalog.we-online.de/pbs/datasheet/860020372005.pdf; Created by: Karrer Zheng; Created Date: 6/8/2015; Capacitance: 68 μF; Application: Medium and high voltage type range from 160V-450V used as primary side input filter in power supply; Low voltage type used as energy storage or low frequency filtering in circuit, applied to general switching power supply, AC-DC converter, adapter, charger, TV, VCR, DC motor circuit filter, digital audio, digital cameras, digital video cameras, satellite receiver etc.
footprint WCAP-ATG5 5x11x2x0.5
pins: 1, 2

## WCAP-ATG5 5x11x2x0.5 860020372006
designator C?, comment 100 μF
WCAP-ATG5 Aluminum Electrolytic Capacitors , 100 μF; + / - 20%; 16 V , 5 x 11; Manufacturer: Wurth Elektronik; partNo: 860020372006; E-mail: libraries@we-online.com; Characteristics: Aluminum Electrolytic Capacitor; Recommended soldering: Wave; Operating temperature:–40 °C to +105 °C for UR < 400 V; –25 °C to +105 °C for UR ≥ 400 V; General purpose product series with max. temperature of +105 °C; Load life: 2000 h @ +105 °C; ComponentLink1Description: Manufacturer; ComponentLink1URL: http://www.we-online.com; ComponentLink2Description: Datasheet; ComponentLink2URL: http://katalog.we-online.de/pbs/datasheet/860020372006.pdf; Created by: Karrer Zheng; Created Date: 6/8/2015; Capacitance: 100 μF; Application: Medium and high voltage type range from 160V-450V used as primary side input filter in power supply; Low voltage type used as energy storage or low frequency filtering in circuit, applied to general switching power supply, AC-DC converter, adapter, charger, TV, VCR, DC motor circuit filter, digital audio, digital cameras, digital video cameras, satellite receiver etc.
footprint WCAP-ATG5 5x11x2x0.5
pins: 1, 2

## WCAP-ATG5 6.3x11x2.5x0.5 860020373007
designator C?, comment 120 μF
WCAP-ATG5 Aluminum Electrolytic Capacitors , 120 μF; + / - 20%; 16 V , 6,3 x 11; Manufacturer: Wurth Elektronik; partNo: 860020373007; E-mail: libraries@we-online.com; Characteristics: Aluminum Electrolytic Capacitor; Recommended soldering: Wave; Operating temperature:–40 °C to +105 °C for UR < 400 V; –25 °C to +105 °C for UR ≥ 400 V; General purpose product series with max. temperature of +105 °C; Load life: 2000 h @ +105 °C; ComponentLink1Description: Manufacturer; ComponentLink1URL: http://www.we-online.com; ComponentLink2Description: Datasheet; ComponentLink2URL: http://katalog.we-online.de/pbs/datasheet/860020373007.pdf; Created by: Karrer Zheng; Created Date: 6/8/2015; Capacitance: 120 μF; Application: Medium and high voltage type range from 160V-450V used as primary side input filter in power supply; Low voltage type used as energy storage or low frequency filtering in circuit, applied to general switching power supply, AC-DC converter, adapter, charger, TV, VCR, DC motor circuit filter, digital audio, digital cameras, digital video cameras, satellite receiver etc.
footprint WCAP-ATG5 6.3x11x2.5x0.5
pins: 1, 2

## WCAP-ATG5 6.3x11x2.5x0.5 860020373008
designator C?, comment 150 μF
WCAP-ATG5 Aluminum Electrolytic Capacitors , 150 μF; + / - 20%; 16 V , 6,3 x 11; Manufacturer: Wurth Elektronik; partNo: 860020373008; E-mail: libraries@we-online.com; Characteristics: Aluminum Electrolytic Capacitor; Recommended soldering: Wave; Operating temperature:–40 °C to +105 °C for UR < 400 V; –25 °C to +105 °C for UR ≥ 400 V; General purpose product series with max. temperature of +105 °C; Load life: 2000 h @ +105 °C; ComponentLink1Description: Manufacturer; ComponentLink1URL: http://www.we-online.com; ComponentLink2Description: Datasheet; ComponentLink2URL: http://katalog.we-online.de/pbs/datasheet/860020373008.pdf; Created by: Karrer Zheng; Created Date: 6/8/2015; Capacitance: 150 μF; Application: Medium and high voltage type range from 160V-450V used as primary side input filter in power supply; Low voltage type used as energy storage or low frequency filtering in circuit, applied to general switching power supply, AC-DC converter, adapter, charger, TV, VCR, DC motor circuit filter, digital audio, digital cameras, digital video cameras, satellite receiver etc.
footprint WCAP-ATG5 6.3x11x2.5x0.5
pins: 1, 2

## WCAP-ATG5 6.3x11x2.5x0.5 860020373009
designator C?, comment 180 μF
WCAP-ATG5 Aluminum Electrolytic Capacitors , 180 μF; + / - 20%; 16 V , 6,3 x 11; Manufacturer: Wurth Elektronik; partNo: 860020373009; E-mail: libraries@we-online.com; Characteristics: Aluminum Electrolytic Capacitor; Recommended soldering: Wave; Operating temperature:–40 °C to +105 °C for UR < 400 V; –25 °C to +105 °C for UR ≥ 400 V; General purpose product series with max. temperature of +105 °C; Load life: 2000 h @ +105 °C; ComponentLink1Description: Manufacturer; ComponentLink1URL: http://www.we-online.com; ComponentLink2Description: Datasheet; ComponentLink2URL: http://katalog.we-online.de/pbs/datasheet/860020373009.pdf; Created by: Karrer Zheng; Created Date: 6/8/2015; Capacitance: 180 μF; Application: Medium and high voltage type range from 160V-450V used as primary side input filter in power supply; Low voltage type used as energy storage or low frequency filtering in circuit, applied to general switching power supply, AC-DC converter, adapter, charger, TV, VCR, DC motor circuit filter, digital audio, digital cameras, digital video cameras, satellite receiver etc.
footprint WCAP-ATG5 6.3x11x2.5x0.5
pins: 1, 2

## WCAP-ATG5 6.3x11x2.5x0.5 860020373010
designator C?, comment 220 μF
WCAP-ATG5 Aluminum Electrolytic Capacitors , 220 μF; + / - 20%; 16 V , 6,3 x 11; Manufacturer: Wurth Elektronik; partNo: 860020373010; E-mail: libraries@we-online.com; Characteristics: Aluminum Electrolytic Capacitor; Recommended soldering: Wave; Operating temperature:–40 °C to +105 °C for UR < 400 V; –25 °C to +105 °C for UR ≥ 400 V; General purpose product series with max. temperature of +105 °C; Load life: 2000 h @ +105 °C; ComponentLink1Description: Manufacturer; ComponentLink1URL: http://www.we-online.com; ComponentLink2Description: Datasheet; ComponentLink2URL: http://katalog.we-online.de/pbs/datasheet/860020373010.pdf; Created by: Karrer Zheng; Created Date: 6/8/2015; Capacitance: 220 μF; Application: Medium and high voltage type range from 160V-450V used as primary side input filter in power supply; Low voltage type used as energy storage or low frequency filtering in circuit, applied to general switching power supply, AC-DC converter, adapter, charger, TV, VCR, DC motor circuit filter, digital audio, digital cameras, digital video cameras, satellite receiver etc.
footprint WCAP-ATG5 6.3x11x2.5x0.5
pins: 1, 2

## WCAP-ATG5 6.3x11x2.5x0.5 860020373011
designator C?, comment 330 μF
WCAP-ATG5 Aluminum Electrolytic Capacitors , 330 μF; + / - 20%; 16 V , 6,3 x 11; Manufacturer: Wurth Elektronik; partNo: 860020373011; E-mail: libraries@we-online.com; Characteristics: Aluminum Electrolytic Capacitor; Recommended soldering: Wave; Operating temperature:–40 °C to +105 °C for UR < 400 V; –25 °C to +105 °C for UR ≥ 400 V; General purpose product series with max. temperature of +105 °C; Load life: 2000 h @ +105 °C; ComponentLink1Description: Manufacturer; ComponentLink1URL: http://www.we-online.com; ComponentLink2Description: Datasheet; ComponentLink2URL: http://katalog.we-online.de/pbs/datasheet/860020373011.pdf; Created by: Karrer Zheng; Created Date: 6/8/2015; Capacitance: 330 μF; Application: Medium and high voltage type range from 160V-450V used as primary side input filter in power supply; Low voltage type used as energy storage or low frequency filtering in circuit, applied to general switching power supply, AC-DC converter, adapter, charger, TV, VCR, DC motor circuit filter, digital audio, digital cameras, digital video cameras, satellite receiver etc.
footprint WCAP-ATG5 6.3x11x2.5x0.5
pins: 1, 2

## WCAP-ATG5 8x11.5x3.5x0.5 860020374012
designator C?, comment 470 μF
WCAP-ATG5 Aluminum Electrolytic Capacitors , 470 μF; + / - 20%; 16 V , 8 x 11,5; Manufacturer: Wurth Elektronik; partNo: 860020374012; E-mail: libraries@we-online.com; Characteristics: Aluminum Electrolytic Capacitor; Recommended soldering: Wave; Operating temperature:–40 °C to +105 °C for UR < 400 V; –25 °C to +105 °C for UR ≥ 400 V; General purpose product series with max. temperature of +105 °C; Load life: 2000 h @ +105 °C; ComponentLink1Description: Manufacturer; ComponentLink1URL: http://www.we-online.com; ComponentLink2Description: Datasheet; ComponentLink2URL: http://katalog.we-online.de/pbs/datasheet/860020374012.pdf; Created by: Karrer Zheng; Created Date: 6/8/2015; Capacitance: 470 μF; Application: Medium and high voltage type range from 160V-450V used as primary side input filter in power supply; Low voltage type used as energy storage or low frequency filtering in circuit, applied to general switching power supply, AC-DC converter, adapter, charger, TV, VCR, DC motor circuit filter, digital audio, digital cameras, digital video cameras, satellite receiver etc.
footprint WCAP-ATG5 8x11.5x3.5x0.5
pins: 1, 2
